# Altium footprint library OneBoxLib_OTHER.PcbLib: 64 footprints (part 4 of 4)
Each footprint in its own frame and in the unit in brackets; x right, y up, seen from the top. Pads: shape width x height; smd on the part's side, far side on the other; paste and mask are expansions set on the pad; w line width, h text height; cw(c..) or ccw(c..) is an arc to the next point about the centre after c.
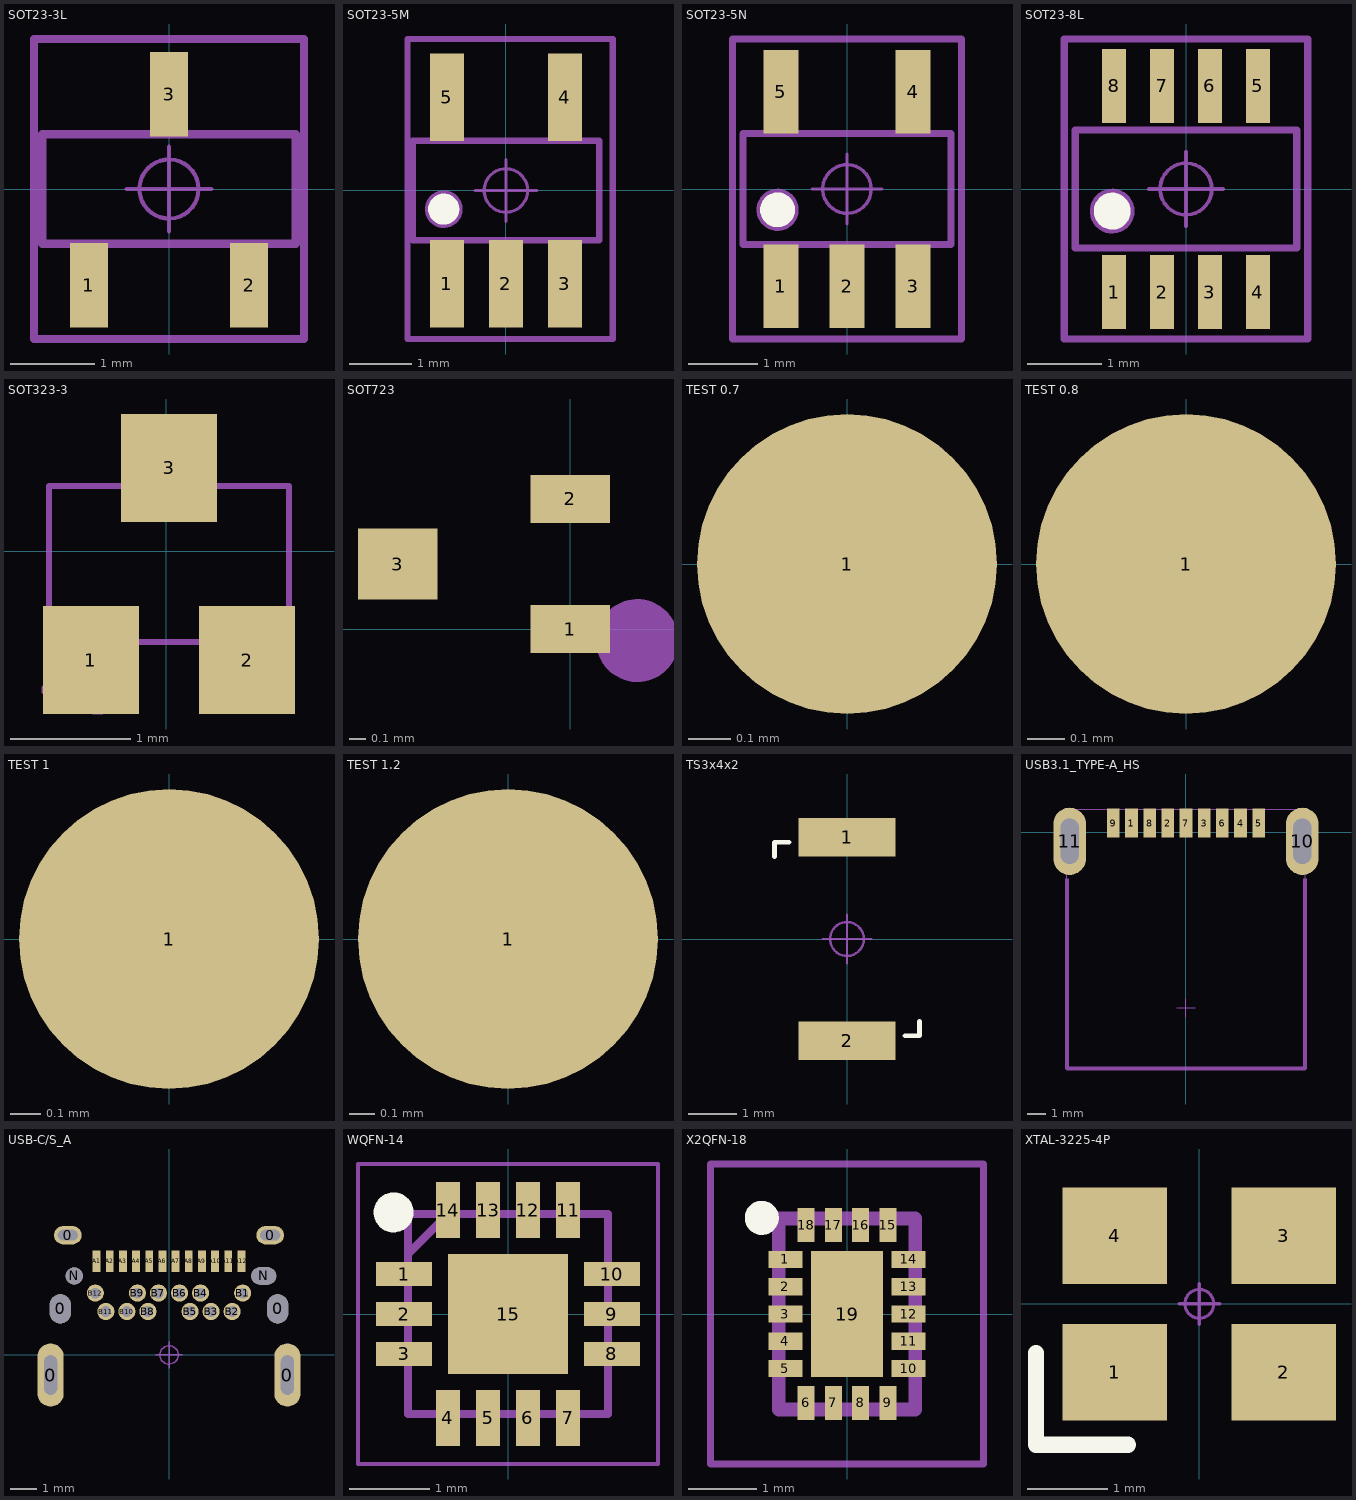
[diagram p3: the footprints below, top view; thin cyan lines are the x and y axes]

## SOT23-3L [mm] "3x1.3x1mm(长宽高)"
height 1.1
pads (3):
  rect 0.45x1 smd: 1(-0.95,-1.143) 2(0.95,-1.143) 3(0,1.125)
Mechanical 13:
  lines w0.1: -1.5,-0.65 1.5,-0.65 1.5,0.65 -1.5,0.65 -1.5,-0.65
Mechanical 15:
  circle w0.05: c0,0 r0.35
  lines w0.05: -0.5,0 0.5,0 ; 0,-0.5 0,0.5
  lines w0.1: -1.6,-1.778 1.6,-1.778 1.6,1.778 -1.6,1.778 -1.6,-1.778
3D body "SOT23-3.STEP": height 1.05, standoff 0, extent -1.5,-1.2 1.5,1.2

## SOT23-5M [mm] "3x1.6x1.1mm(长宽高)"
pads (5):
  rect 0.55x1.4 smd: 1(-0.95,-1.5) 2(0,-1.5) 3(0.95,-1.5) 4(0.95,1.5) 5(-0.95,1.5)
Top Overlay:
  circle w0.25: c-1,-0.3 r0.125
Mechanical 13:
  circle w0.1: c-1,-0.3 r0.254
  lines w0.1: -1.5,-0.8 1.5,-0.8 1.5,0.8 -1.5,0.8 -1.5,-0.8
Mechanical 15:
  circle w0.05: c0,0 r0.35
  lines w0.05: -0.5,0 0.5,0 ; 0,-0.5 0,0.5
  lines w0.1: -1.585,-2.389 1.717,-2.389 1.717,2.437 -1.585,2.437 -1.585,-2.389
3D body "SOT23-5.STEP": height 1.15, standoff -0.03, extent -1.5,-1.403 1.5,1.403

## SOT23-5N [mm] "3x1.6x1.1mm(长宽高)"
pads (5):
  rect 0.5x1.2 smd: 1(-0.95,-1.4) 2(0,-1.4) 3(0.95,-1.4) 4(0.95,1.4) 5(-0.95,1.4)
Top Overlay:
  circle w0.25: c-1,-0.3 r0.125
Mechanical 13:
  circle w0.1: c-1,-0.3 r0.254
  lines w0.1: -1.5,-0.8 1.5,-0.8 1.5,0.8 -1.5,0.8 -1.5,-0.8
Mechanical 15:
  circle w0.05: c0,0 r0.35
  lines w0.05: -0.5,0 0.5,0 ; 0,-0.5 0,0.5
  lines w0.1: -1.651,-2.159 -1.651,2.159 1.651,2.159 1.651,-2.159 -1.651,-2.159
3D body "SOT23-5.STEP": height 1.15, standoff -0.03, extent -1.5,-1.403 1.5,1.403

## SOT23-8L [mm] "3x1.6x1.1mm(长宽高)"
height 1.45
pads (8):
  rect 0.325x1 smd: 1(-0.975,-1.397) 2(-0.325,-1.397) 3(0.325,-1.397) 4(0.975,-1.397) 5(0.975,1.397) 6(0.325,1.397) 7(-0.325,1.397) 8(-0.975,1.397)
Top Overlay:
  circle w0.25: c-1,-0.3 r0.125
Mechanical 13:
  circle w0.1: c-1,-0.3 r0.254
  lines w0.1: -1.5,-0.8 1.5,-0.8 1.5,0.8 -1.5,0.8 -1.5,-0.8
Mechanical 15:
  circle w0.05: c0,0 r0.35
  lines w0.05: -0.5,0 0.5,0 ; 0,-0.5 0,0.5
  lines w0.1: -1.65,-2.032 1.65,-2.032 1.65,2.032 -1.65,2.032 -1.65,-2.032
3D body "SOT23-8.STEP": height 1.15, standoff 0, extent -1.5,-1.403 1.5,1.403

## SOT323-3 [mil] "3x1.3x1mm(长宽高)"
height 43.31
pads (3):
  rect 31.5x35.4 smd mask+2: 1(-24.62,-35.7) 2(26.58,-35.7) 3(0.98,27.3)
Mechanical 6:
  circle w10: c-22.62,-43.6 r5
Mechanical 15:
  region: -38.42,-47.9 -37.42,-47.9 -36.02,-46.49 -36.02,-44.51 -37.42,-43.1 -38.42,-43.1 -39.41,-43.1 -40.82,-44.51 -40.82,-46.49 -39.41,-47.9
  region: -32.52,-27.8 -16.72,-27.8 -16.72,-45.5 -32.52,-45.5
  region: 18.68,-27.8 34.48,-27.8 34.48,-45.5 18.68,-45.5
  region: 8.88,19.4 -6.92,19.4 -6.92,37.1 8.88,37.1
  lines w2: -38.42,-29.8 40.38,-29.8 40.38,21.4 -38.42,21.4 -38.42,-29.8
3D body "SOT-323.step": height 46.28, standoff 0, extent -38.15,-47.62 40.55,35.02

## SOT723 [mm]
pads (3):
  rect 0.489x0.294 smd: 1(0,0) 2(0,0.8)
  rect 0.489x0.434 smd: 3(-1.059,0.4)
Mechanical 15:
  circle w0.254: c0.411,-0.07 r0.127
3D body "SOT-723.STEP": height 0.5, standoff -0.05, extent -1.101,-0.2 0.1,1

## TEST 0.7 [mm] "测试点0.7mm"
pads (1):
  round 0.7 smd: 1(0,0)

## TEST 0.8 [mm] "测试点0.8mm"
pads (1):
  round 0.8 smd: 1(0,0)

## TEST 1 [mm] "测试点1mm"
pads (1):
  round 1 smd paste-1: 1(0,0)

## TEST 1.2 [mm] "测试点1.2mm"
pads (1):
  round 1.2 smd paste-1.2: 1(0,0)

## TS3x4x2 [mm] "防水轻触开关3x4x2"
pads (2):
  rect 2x0.8 smd: 1(0,2.1) 2(0,-2.1)
Top Overlay:
  lines w0.1: -1.5,1.7 -1.5,2 -1.2,2 ; 1.2,-2 1.5,-2 1.5,-1.7
Mechanical 15:
  circle w0.05: c0,0 r0.35
  lines w0.05: -0.5,0 0.5,0 ; 0,-0.5 0,0.5
3D body "SW3x4.STEP": height 2, standoff 0, extent -1.5,-2.2 1.5,2.2

## USB3.1_TYPE-A_HS [mm] "USB 3.1 Type A"
height 6.99
pads (11):
  rect 0.7x1.6 smd mask+0.05: 1(-3,0.5) 2(-1,0.5) 3(1,0.5) 4(3,0.5) 5(4,0.5) 6(2,0.5) 7(0,0.5) 8(-2,0.5) 9(-4,0.5)
  oval 1.8x3.7 hole 1 slot 2.5 at 90 deg mask+0.05: 10(6.4,-0.5) 11(-6.4,-0.5)
Top Paste:
  region: -7.3,0.45 -7.3,0.568 -7.238,0.797 -7.12,1.002 -6.952,1.17 -6.747,1.288 -6.518,1.35 -6.281,1.35 -6.052,1.288 -5.847,1.17 -5.679,1.002 -5.561,0.797 -5.5,0.568 -5.5,0.45 -5.5,-1.45 -5.5,-1.569 -5.561,-1.798 -5.679,-2.003 -5.847,-2.171 -6.052,-2.289 -6.281,-2.35 -6.518,-2.35 -6.747,-2.289 -6.952,-2.171 -7.12,-2.003 -7.238,-1.798 -7.3,-1.569 -7.3,-1.45
  region: 5.5,0.45 5.502,0.567 5.564,0.794 5.683,0.998 5.851,1.164 6.055,1.281 6.283,1.341 6.518,1.341 6.746,1.281 6.95,1.164 7.118,0.998 7.237,0.794 7.299,0.567 7.3,0.45 7.3,-1.45 7.299,-1.568 7.237,-1.795 7.118,-1.999 6.95,-2.164 6.746,-2.281 6.518,-2.342 6.283,-2.342 6.055,-2.281 5.851,-2.164 5.683,-1.999 5.564,-1.795 5.502,-1.568 5.5,-1.45
  region: -4.35,1.3 -3.65,1.3 -3.65,-0.3 -4.35,-0.3
  region: -3.35,1.3 -2.65,1.3 -2.65,-0.3 -3.35,-0.3
  region: -2.35,1.3 -1.65,1.3 -1.65,-0.3 -2.35,-0.3
  region: -1.35,1.3 -0.65,1.3 -0.65,-0.3 -1.35,-0.3
  region: -0.35,1.3 0.35,1.3 0.35,-0.3 -0.35,-0.3
  region: 0.65,1.3 1.35,1.3 1.35,-0.3 0.65,-0.3
  region: 1.65,1.3 2.35,1.3 2.35,-0.3 1.65,-0.3
  region: 2.65,1.3 3.35,1.3 3.35,-0.3 2.65,-0.3
  region: 3.65,1.3 4.35,1.3 4.35,-0.3 3.65,-0.3
Mechanical 6:
  region: -6.65,-2.6 -6.65,-13 -6.55,-13.1 6.55,-13.1 6.65,-13 6.65,-2.55 6.45,-2.55 6.45,-12.9 -6.45,-12.9 -6.45,-2.55 -6.65,-2.55
Mechanical 15:
  region: -6.49,1.25 -6.49,1.275 -6.525,1.31 -6.575,1.31 -6.61,1.275 -6.61,1.25 -6.61,1.225 -6.575,1.19 -6.525,1.19 -6.49,1.225
  region: -6.55,0.5 -6.25,0.5 -6.25,-1.5 -6.55,-1.5
  region: 6.25,0.5 6.55,0.5 6.55,-1.5 6.25,-1.5
  region: 3.82,1 4.18,1 4.18,0 3.82,0
  region: 2.82,1 3.18,1 3.18,0 2.82,0
  region: 1.82,1 2.18,1 2.18,0 1.82,0
  region: 0.82,1 1.18,1 1.18,0 0.82,0
  region: -0.18,1 0.18,1 0.18,0 -0.18,0
  region: -1.18,1 -0.82,1 -0.82,0 -1.18,0
  region: -2.18,1 -1.82,1 -1.82,0 -2.18,0
  region: -3.18,1 -2.82,1 -2.82,0 -3.18,0
  region: -4.18,1 -3.82,1 -3.82,0 -4.18,0
  lines w0.05: -0.5,-9.669 0.5,-9.669 ; 0,-10.169 0,-9.169
  lines w0.051: -6.55,-13 -6.55,1.25 6.55,1.25 6.55,-13 -6.55,-13
3D body "USB_3_0_TYPE_A.STEP": height 6.71, standoff -2, extent -6.57,-12.98 6.53,1.07

## USB-C/S_A [mm] "Type-C 24P母座"
pads (32):
  oval 1x2.4 hole 0.5 slot 1.5 at 90 deg: 0(-4.5,-0.765) 0(4.5,-0.765)
  oval 0.8x1.1 hole 0.8 slot 1.1 at 90 deg: 0(-4.13,1.75) 0(4.13,1.75)
  oval 1.05x0.7 hole 0.4 slot 0.75 at 0 deg: 0(-3.845,4.55) 0(3.845,4.55)
  rect 0.3x0.8 smd: A1(-2.75,3.56) A2(-2.25,3.56) A3(-1.75,3.56) A4(-1.25,3.56) A5(-0.75,3.56) A6(-0.25,3.56) A7(0.25,3.56) A8(0.75,3.56) A9(1.25,3.56) A10(1.75,3.56) A11(2.25,3.56) A12(2.75,3.56)
  round 0.65 hole 0.4: B1(2.8,2.35) B2(2.4,1.65) B3(1.6,1.65) B4(1.2,2.35) B5(0.8,1.65) B6(0.4,2.35) B7(-0.4,2.35) B8(-0.8,1.65) B9(-1.2,2.35) B10(-1.6,1.65) B11(-2.4,1.65) B12(-2.8,2.35)
  round 0.65 hole 0.65: N(-3.6,3)
  oval 0.95x0.65 hole 0.65 slot 0.95 at 0 deg: N(3.6,3)
Mechanical 15:
  circle w0.05: c0,0 r0.35
  lines w0.05: -0.5,0 0.5,0 ; 0,-0.5 0,0.5
3D body "type-Cĸ?": height 3.35, standoff -0.9, extent -4.625,-4.45 4.625,4.65

## WQFN-14 [mm]
pads (15):
  rect 0.7x0.3 smd: 1(-1.3,0.5) 2(-1.3,0) 3(-1.3,-0.5) 8(1.3,-0.5) 9(1.3,0) 10(1.3,0.5)
  rect 0.3x0.7 smd: 4(-0.75,-1.3) 5(-0.25,-1.3) 6(0.25,-1.3) 7(0.75,-1.3) 11(0.75,1.3) 12(0.25,1.3) 13(-0.25,1.3) 14(-0.75,1.3)
  rect 1.5x1.5 smd: 15(0,0)
Top Overlay:
  circle w0.25: c-1.43,1.27 r0.125
Mechanical 13:
  lines w0.1: -1.25,0.75 -0.75,1.25 ; -1.25,-1.25 1.25,-1.25 1.25,1.25 -1.25,1.25 -1.25,-1.25
Mechanical 15:
  lines w0.05: -1.875,-1.875 1.875,-1.875 1.875,1.875 -1.875,1.875 -1.875,-1.875
3D body "FUSB302BMPX.stp": height 0.8, standoff 0, extent -1.3,-1.3 1.3,1.3

## X2QFN-18 [mm]
pads (19):
  rect 0.5x0.25 smd: 1(-0.905,0.8) 2(-0.905,0.4) 3(-0.905,0) 4(-0.905,-0.4) 5(-0.905,-0.8) 10(0.905,-0.8) 11(0.905,-0.4) 12(0.905,0) 13(0.905,0.4) 14(0.905,0.8)
  rect 0.25x0.5 smd: 6(-0.6,-1.305) 7(-0.2,-1.305) 8(0.2,-1.305) 9(0.6,-1.305) 15(0.6,1.305) 16(0.2,1.305) 17(-0.2,1.305) 18(-0.6,1.305)
  rect 1.05x1.85 smd: 19(0,0)
Top Overlay:
  circle w0.25: c-1.25,1.41 r0.125
Mechanical 13:
  lines w0.2: -1,-1.4 1,-1.4 1,1.4 -1,1.4 -1,-1.4
Mechanical 15:
  lines w0.1: -2,-2.2 2,-2.2 2,2.2 -2,2.2 -2,-2.2
3D body "FUSB340TMX.stp": height 0.5, standoff 0, extent -1,-1.4 1,1.4

## XTAL-3225-4P [mm] "3.2*2.5*0.7mm(长宽高)"
pads (4):
  rect 1.3x1.2 smd: 1(-1.05,-0.85) 2(1.05,-0.85) 3(1.05,0.85) 4(-1.05,0.85)
Top Overlay:
  lines w0.2: -2.032,-1.753 -0.889,-1.753 ; -2.032,-1.727 -2.032,-0.61
Mechanical 15:
  circle w0.04: c0,0 r0.18
  lines w0.04: -0.254,0 0.254,0 ; 0,-0.254 0,0.254
3D body "OSC_3225.STEP": height 0.7, standoff -0.02, extent -1.6,-1.25 1.6,1.25